# Altium footprint library lib_protel_HC.PCBLIB: 724 footprints (part 1 of 46)
Each footprint in its own frame and in the unit in brackets; x right, y up, seen from the top. Pads: shape width x height; smd on the part's side, far side on the other; paste and mask are expansions set on the pad; w line width, h text height; cw(c..) or ccw(c..) is an arc to the next point about the centre after c.
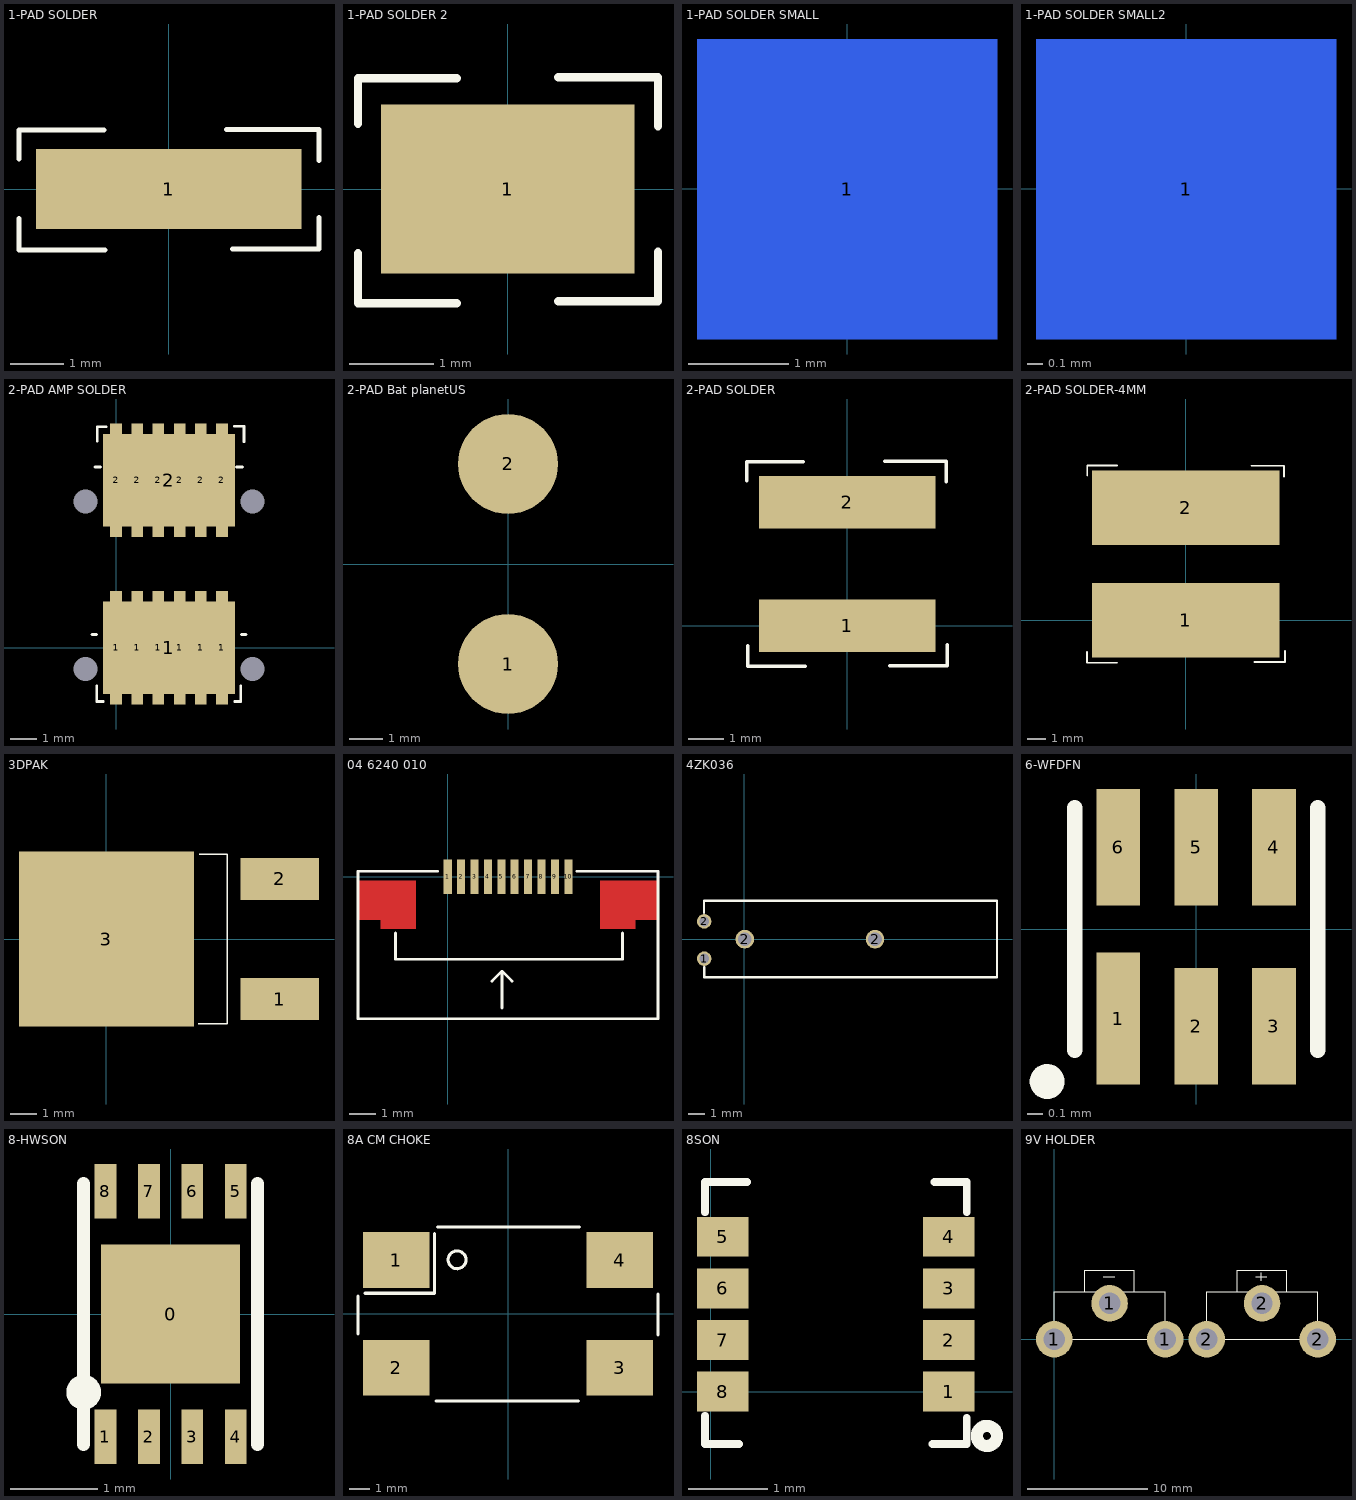
[diagram p0: the footprints below, top view; thin cyan lines are the x and y axes]

## 1-PAD SOLDER [mm] "1 PAD DE SOLDADURA"
pads (1):
  rect 5x1.5 smd: 1(0,0)
Top Overlay:
  lines w0.1: -2.82,-0.56 -2.82,-1.15 -1.2,-1.15 ; -2.82,0.57 -2.82,1.11 -1.22,1.11 ; 1.09,1.12 2.83,1.12 2.83,0.54 ; 1.2,-1.13 2.83,-1.13 2.83,-0.54

## 1-PAD SOLDER 2 [mm] "1 PAD DE SOLDADURA"
pads (1):
  rect 3x2 smd: 1(0,0)
Top Overlay:
  lines w0.1: -1.77,-0.76 -1.77,-1.35 -0.6,-1.35 ; -1.77,0.77 -1.77,1.31 -0.6,1.31 ; 0.6,-1.33 1.78,-1.33 1.78,-0.74 ; 0.6,1.32 1.78,1.32 1.78,0.74

## 1-PAD SOLDER SMALL [mm] "1 PAD DE SOLDADURA"
pads (1):
  rect 3x3 smd far side paste+0 mask+0: 1(0,0)

## 1-PAD SOLDER SMALL2 [mm] "1 PAD DE SOLDADURA"
pads (1):
  rect 2x2 smd far side paste+0 mask+0: 1(0,0)

## 2-PAD AMP SOLDER [mm] "2 PAD´S DE SOLDADURA AMPLIADOS DAMM"
pads (18):
  round 0 hole 0.9: 0(-1.15,-0.798) 0(-1.15,5.527) 0(5.15,-0.798) 0(5.15,5.527)
  rect 0.44x4.3 smd: 1(0,0.002) 1(0.8,0.002) 1(1.6,0.002) 1(2.4,0.002) 1(3.2,0.002) 1(4,0.002) 2(0,6.327) 2(0.8,6.327) 2(1.6,6.327) 2(2.4,6.327) 2(3.2,6.327) 2(4,6.327)
  rect 5x3.5 smd: 1(2,0) 2(2,6.327)
Top Overlay:
  lines w0.1: -0.73,-1.44 -0.73,-2.03 -0.48,-2.03 ; -0.71,7.81 -0.71,8.35 -0.38,8.35 ; 4.47,8.36 4.83,8.36 4.83,7.78 ; 4.48,-2.03 4.71,-2.03 4.71,-1.44
  lines w0.127: -0.9,0.502 -0.75,0.502 ; -0.79,6.827 -0.6,6.827 ; 4.55,6.827 4.77,6.827 ; 4.75,0.502 4.9,0.502

## 2-PAD Bat planetUS [mm] "2 PAD´S DE SOLDADURA"
pads (2):
  round 3 smd: 1(0,-3) 2(0,3)

## 2-PAD SOLDER [mm] "2 PAD´S DE SOLDADURA"
pads (2):
  rect 5x1.5 smd: 1(0,0) 2(0,3.5)
Top Overlay:
  lines w0.1: -2.85,4.11 -2.85,4.65 -1.25,4.65 ; -2.82,-0.56 -2.82,-1.15 -1.2,-1.15 ; 1.06,4.66 2.8,4.66 2.8,4.08 ; 1.2,-1.13 2.83,-1.13 2.83,-0.54

## 2-PAD SOLDER-4MM [mm] "2 PAD´S DE SOLDADURA 4MM ANCHURA"
pads (2):
  rect 10x4 smd: 1(0,0) 2(0,6)
Top Overlay:
  lines w0.1: -5.284,-1.678 -5.284,-2.268 -3.664,-2.268 ; -5.263,7.717 -5.263,8.257 -3.663,8.257 ; 3.498,8.241 5.238,8.241 5.238,7.661 ; 3.664,-2.222 5.294,-2.222 5.294,-1.632

## 3DPAK [mm] "3DPAK REGULADOR"
height 2.4
pads (3):
  rect 3x1.6 smd mask+0.1: 1(6.65,-2.3) 2(6.65,2.3)
  rect 6.7x6.7 smd mask+0.1: 3(0,0)
Top Overlay:
  lines w0.051: 3.525,-3.25 4.625,-3.25 4.625,3.25 3.55,3.25

## 04 6240 010 [mm] "CONNECTOR KYOCERA 04 6240 010"
height 2
pads (10):
  rect 0.3x1.3 smd: 1(0,0) 2(0.5,0) 3(1,0) 4(1.5,0) 5(2,0) 6(2.5,0) 7(3,0) 8(3.5,0) 9(4,0) 10(4.5,0)
Top Layer:
  region: -1.2,-1.95 -2.5,-1.95 -2.5,-1.6 -3.3,-1.6 -3.3,-0.15 -1.2,-0.15
  region: 5.7,-1.95 5.7,-0.15 7.8,-0.15 7.8,-1.6 7,-1.6 7,-1.95
Top Overlay:
  lines w0.1: -1.95,-2.1 -1.95,-3.075 ; -0.375,0.2 -3.35,0.2 -3.35,-5.3 7.85,-5.3 7.85,0.2 4.825,0.2 ; 1.65,-3.9 2.025,-3.525 ; 2.025,-4.9 2.025,-3.525 ; 2.4,-3.9 2.025,-3.525 ; 6.525,-2.1 6.525,-3.075 -1.95,-3.075 ; -1.95,-3.075 -1.95,-3.075

## 4ZK036 [mil] "micromotor vibración"
pads (4):
  round 35 hole 24: 1(-97,-47) 2(-97,43)
  round 45 hole 33: 2(1,0) 2(316,0)
Top Overlay:
  lines w5: -98,64 -98,93 611,93 611,-92 -97,-92 -97,-67

## 6-WFDFN [mm] "6-WFDFN"
height 0.8
pads (6):
  rect 0.28x0.85 smd: 1(-0.5,-0.575)
  rect 0.28x0.75 smd: 2(0,-0.625) 3(0.5,-0.625) 4(0.5,0.525) 5(0,0.525) 6(-0.5,0.525)
Top Overlay:
  circle w0.128: c-0.958,-0.98 r0.048
  lines w0.1: -0.78,-0.78 -0.78,0.78 ; 0.78,-0.78 0.78,0.78
3D body: height 0.8, standoff 0, extent -0.775,-0.775 0.775,0.78

## 8-HWSON [mm] "PCF85063TP/1Z"
pads (9):
  rect 1.6x1.6 smd: 0(0,0)
  rect 0.25x0.625 smd: 1(-0.75,-1.412) 2(-0.25,-1.412) 3(0.25,-1.412) 4(0.75,-1.412) 5(0.75,1.413) 6(0.25,1.413) 7(-0.25,1.413) 8(-0.75,1.413)
Top Overlay:
  circle w0.2: c-1,-0.9 r0.1
  lines w0.15: -1,-1.5 -1,1.5 ; 1,-1.5 1,1.5
3D body: height 0.75, standoff 0, extent -1,-1.5 1,1.5

## 8A CM CHOKE [mm]
height 1.7
pads (4):
  rect 3.2x2.7 smd: 1(-5.4,2.6) 2(-5.4,-2.6) 3(5.4,-2.6) 4(5.4,2.6)
Top Overlay:
  circle w0.152: c-2.464,2.616 r0.432
  lines w0.15: -7.25,-0.963 -7.25,0.856 ; -6.906,1 -3.55,1 -3.55,3.878 ; -3.484,-4.2 3.406,-4.214 ; -3.412,4.207 3.448,4.207 ; 7.25,-1.014 7.25,0.964

## 8SON [mm] "CSD17308Q3"
height 1
pads (8):
  rect 0.65x0.5 smd: 1(3,0) 2(3,0.65) 3(3,1.3) 4(3,1.95) 5(0.15,1.95) 6(0.15,1.3) 7(0.15,0.65) 8(0.15,0)
Top Overlay:
  circle w0.152: c3.48,-0.559 r0.127
  lines w0.1: -0.076,-0.305 -0.076,-0.66 0.356,-0.66 ; -0.076,2.261 -0.076,2.642 0.457,2.642 ; 2.794,-0.66 3.226,-0.66 3.226,-0.33 ; 2.819,2.642 3.226,2.642 3.226,2.261

## 9V HOLDER [mil] "PORTAPILAS BATERÍA 9V, COMPONENTES SUELTOS."
height 55.12
pads (6):
  round 120 hole 70 mask+3.94: 1(0,0) 1(182,118) 1(365,0) 2(501,0) 2(683,118) 2(866,0)
Top Overlay:
  lines w2: 101,157 101,226 263,226 263,156 ; 161,205 199,205 ; 602,157 602,226 764,226 764,156 ; 662,206 698,206 ; 680,193 680,219 ; 0,0 365,0 365,156 0,156 0,0 ; 501,0 501,156 866,156 866,0 501,0